# Altium schematic symbol library jlcpcb_2025_04_capacitors_extended_0805.schlib: 3281 symbols (part 6 of 18) (continued)
## C0805X332K251T
designator C?  Capacitance: 3.3nF  (hidden comment: *)
Capacitor, Ceramic (MLCC), 3.3nF, ±10%, 250V, X7R, ±10%, SMD 0805; Manufacturer: IHHEC(HOLY STONE ENTERPRISE CO., LTD); Manufacturer Part Number: C0805X332K251T; Package Size: 0805; JLCPCB Basic Part: No; JLCPCB Part Number: C105958; Supplier 1: LCSC; Category: Capacitors - MLCC; Supplier Part Number 1: C105958; Tolerance: ±10%; Voltage Rating: 250V; Temperature Coefficient: X7R; RoHS: Yes; ComponentLink1Description: Datasheet; ComponentLink1URL: https://wmsc.lcsc.com/wmsc/upload/file/pdf/v2/lcsc/2304140030_IHHEC-HOLY-STONE-ENTERPRISE-CO---LTD-C0805X332K251T_C105958.pdf; ComponentLink2Description: JLCPCB Part URL; ComponentLink2URL: https://jlcpcb.com/partdetail/C105958; ComponentLink3Description: LCSC Part URL; ComponentLink3URL: https://lcsc.com/product-detail/Multilayer-Ceramic-Capacitors-MLCC---SMD-SMT_IHHECHOLY-STONE-ENTERPRISE-CO.%2C-LTD-IHHECHOLY-STONE-ENTERPRISE-CO.%2C-LTD-C0805X332K251T_C105958.html
footprint CAP-0805 (0805 (2012M) Capacitor)
pins: 1, 2

## C0805X333K251T
designator C?  Capacitance: 33nF  (hidden comment: *)
Capacitor, Ceramic (MLCC), 33nF, ±10%, 250V, X7R, ±10%, SMD 0805; Manufacturer: IHHEC(HOLY STONE ENTERPRISE CO., LTD); Manufacturer Part Number: C0805X333K251T; Package Size: 0805; JLCPCB Basic Part: No; JLCPCB Part Number: C2915751; Supplier 1: LCSC; Category: Capacitors - MLCC; Supplier Part Number 1: C2915751; Tolerance: ±10%; Voltage Rating: 250V; Temperature Coefficient: X7R; RoHS: Yes; ComponentLink1Description: Datasheet; ComponentLink1URL: https://wmsc.lcsc.com/wmsc/upload/file/pdf/v2/lcsc/2111172030_IHHEC-HOLY-STONE-ENTERPRISE-CO---LTD-C0805X333K251T_C2915751.pdf; ComponentLink2Description: JLCPCB Part URL; ComponentLink2URL: https://jlcpcb.com/partdetail/C2915751; ComponentLink3Description: LCSC Part URL; ComponentLink3URL: https://lcsc.com/product-detail/Multilayer-Ceramic-Capacitors-MLCC---SMD-SMT_IHHECHOLY-STONE-ENTERPRISE-CO.%2C-LTD-IHHECHOLY-STONE-ENTERPRISE-CO.%2C-LTD-C0805X333K251T_C2915751.html
footprint CAP-0805 (0805 (2012M) Capacitor)
pins: 1, 2

## C0805X391K101T
designator C?  Capacitance: 390pF  (hidden comment: *)
Capacitor, Ceramic (MLCC), 390pF, ±10%, 100V, X7R, ±10%, SMD 0805; Manufacturer: IHHEC(HOLY STONE ENTERPRISE CO., LTD); Manufacturer Part Number: C0805X391K101T; Package Size: 0805; JLCPCB Basic Part: No; JLCPCB Part Number: C340317; Supplier 1: LCSC; Category: Capacitors - MLCC; Supplier Part Number 1: C340317; Tolerance: ±10%; Voltage Rating: 100V; Temperature Coefficient: X7R; RoHS: Yes; ComponentLink1Description: Datasheet; ComponentLink1URL: https://wmsc.lcsc.com/wmsc/upload/file/pdf/v2/lcsc/2304140030_IHHEC-HOLY-STONE-ENTERPRISE-CO---LTD-C0805X391K101T_C340317.pdf; ComponentLink2Description: JLCPCB Part URL; ComponentLink2URL: https://jlcpcb.com/partdetail/C340317; ComponentLink3Description: LCSC Part URL; ComponentLink3URL: https://lcsc.com/product-detail/Multilayer-Ceramic-Capacitors-MLCC---SMD-SMT_IHHECHOLY-STONE-ENTERPRISE-CO.%2C-LTD-IHHECHOLY-STONE-ENTERPRISE-CO.%2C-LTD-C0805X391K101T_C340317.html
footprint CAP-0805 (0805 (2012M) Capacitor)
pins: 1, 2

## C0805X392K251T
designator C?  Capacitance: 3.9nF  (hidden comment: *)
Capacitor, Ceramic (MLCC), 3.9nF, ±10%, 250V, X7R, ±10%, SMD 0805; Manufacturer: IHHEC(HOLY STONE ENTERPRISE CO., LTD); Manufacturer Part Number: C0805X392K251T; Package Size: 0805; JLCPCB Basic Part: No; JLCPCB Part Number: C340301; Supplier 1: LCSC; Category: Capacitors - MLCC; Supplier Part Number 1: C340301; Tolerance: ±10%; Voltage Rating: 250V; Temperature Coefficient: X7R; RoHS: Yes; ComponentLink1Description: Datasheet; ComponentLink1URL: https://wmsc.lcsc.com/wmsc/upload/file/pdf/v2/lcsc/2304140030_IHHEC-HOLY-STONE-ENTERPRISE-CO---LTD-C0805X392K251T_C340301.pdf; ComponentLink2Description: JLCPCB Part URL; ComponentLink2URL: https://jlcpcb.com/partdetail/C340301; ComponentLink3Description: LCSC Part URL; ComponentLink3URL: https://lcsc.com/product-detail/Multilayer-Ceramic-Capacitors-MLCC---SMD-SMT_IHHECHOLY-STONE-ENTERPRISE-CO.%2C-LTD-IHHECHOLY-STONE-ENTERPRISE-CO.%2C-LTD-C0805X392K251T_C340301.html
footprint CAP-0805 (0805 (2012M) Capacitor)
pins: 1, 2

## C0805X471K050T
designator C?  Capacitance: 470pF  (hidden comment: *)
Capacitor, Ceramic (MLCC), 470pF, ±10%, 50V, X7R, ±10%, SMD 0805; Manufacturer: IHHEC(HOLY STONE ENTERPRISE CO., LTD); Manufacturer Part Number: C0805X471K050T; Package Size: 0805; JLCPCB Basic Part: No; JLCPCB Part Number: C559301; Supplier 1: LCSC; Category: Capacitors - MLCC; Supplier Part Number 1: C559301; Tolerance: ±10%; Voltage Rating: 50V; Temperature Coefficient: X7R; RoHS: Yes; ComponentLink1Description: Datasheet; ComponentLink1URL: https://wmsc.lcsc.com/wmsc/upload/file/pdf/v2/lcsc/2005271132_IHHEC-HOLY-STONE-ENTERPRISE-CO---LTD-C0805X471K050T_C559301.pdf; ComponentLink2Description: JLCPCB Part URL; ComponentLink2URL: https://jlcpcb.com/partdetail/C559301; ComponentLink3Description: LCSC Part URL; ComponentLink3URL: https://lcsc.com/product-detail/Multilayer-Ceramic-Capacitors-MLCC---SMD-SMT_IHHECHOLY-STONE-ENTERPRISE-CO.%2C-LTD-IHHECHOLY-STONE-ENTERPRISE-CO.%2C-LTD-C0805X471K050T_C559301.html
footprint CAP-0805 (0805 (2012M) Capacitor)
pins: 1, 2

## C0805X471K102T
designator C?  Capacitance: 470pF  (hidden comment: *)
Capacitor, Ceramic (MLCC), 470pF, ±10%, 1kV, X7R, ±10%, SMD 0805; Manufacturer: IHHEC(HOLY STONE ENTERPRISE CO., LTD); Manufacturer Part Number: C0805X471K102T; Package Size: 0805; JLCPCB Basic Part: No; JLCPCB Part Number: C2915752; Supplier 1: LCSC; Category: Capacitors - MLCC; Supplier Part Number 1: C2915752; Tolerance: ±10%; Voltage Rating: 1kV; Temperature Coefficient: X7R; RoHS: Yes; ComponentLink1Description: Datasheet; ComponentLink1URL: https://wmsc.lcsc.com/wmsc/upload/file/pdf/v2/lcsc/2111172030_IHHEC-HOLY-STONE-ENTERPRISE-CO---LTD-C0805X471K102T_C2915752.pdf; ComponentLink2Description: JLCPCB Part URL; ComponentLink2URL: https://jlcpcb.com/partdetail/C2915752; ComponentLink3Description: LCSC Part URL; ComponentLink3URL: https://lcsc.com/product-detail/Multilayer-Ceramic-Capacitors-MLCC---SMD-SMT_IHHECHOLY-STONE-ENTERPRISE-CO.%2C-LTD-IHHECHOLY-STONE-ENTERPRISE-CO.%2C-LTD-C0805X471K102T_C2915752.html
footprint CAP-0805 (0805 (2012M) Capacitor)
pins: 1, 2

## C0805X472K501T
designator C?  Capacitance: 4.7nF  (hidden comment: *)
Capacitor, Ceramic (MLCC), 4.7nF, 500V, X7R, SMD 0805; Manufacturer: IHHEC(HOLY STONE ENTERPRISE CO., LTD); Manufacturer Part Number: C0805X472K501T; Package Size: 0805; JLCPCB Basic Part: No; JLCPCB Part Number: C2915754; Supplier 1: LCSC; Category: Capacitors - MLCC; Supplier Part Number 1: C2915754; Voltage Rating: 500V; Temperature Coefficient: X7R; RoHS: Yes; ComponentLink1Description: Datasheet; ComponentLink1URL: https://wmsc.lcsc.com/wmsc/upload/file/pdf/v2/lcsc/2111161830_IHHEC-HOLY-STONE-ENTERPRISE-CO---LTD-C0805X472K501T_C2915754.pdf; ComponentLink2Description: JLCPCB Part URL; ComponentLink2URL: https://jlcpcb.com/partdetail/C2915754; ComponentLink3Description: LCSC Part URL; ComponentLink3URL: https://lcsc.com/product-detail/Multilayer-Ceramic-Capacitors-MLCC---SMD-SMT_IHHECHOLY-STONE-ENTERPRISE-CO.%2C-LTD-IHHECHOLY-STONE-ENTERPRISE-CO.%2C-LTD-C0805X472K501T_C2915754.html
footprint CAP-0805 (0805 (2012M) Capacitor)
pins: 1, 2

## C0805X473K101T
designator C?  Capacitance: 47nF  (hidden comment: *)
Capacitor, Ceramic (MLCC), 47nF, ±10%, 100V, X7R, ±10%, SMD 0805; Manufacturer: IHHEC(HOLY STONE ENTERPRISE CO., LTD); Manufacturer Part Number: C0805X473K101T; Package Size: 0805; JLCPCB Basic Part: No; JLCPCB Part Number: C105959; Supplier 1: LCSC; Category: Capacitors - MLCC; Supplier Part Number 1: C105959; Tolerance: ±10%; Voltage Rating: 100V; Temperature Coefficient: X7R; RoHS: Yes; ComponentLink1Description: Datasheet; ComponentLink1URL: https://wmsc.lcsc.com/wmsc/upload/file/pdf/v2/lcsc/2304140030_IHHEC-HOLY-STONE-ENTERPRISE-CO---LTD-C0805X473K101T_C105959.pdf; ComponentLink2Description: JLCPCB Part URL; ComponentLink2URL: https://jlcpcb.com/partdetail/C105959; ComponentLink3Description: LCSC Part URL; ComponentLink3URL: https://lcsc.com/product-detail/Multilayer-Ceramic-Capacitors-MLCC---SMD-SMT_IHHECHOLY-STONE-ENTERPRISE-CO.%2C-LTD-IHHECHOLY-STONE-ENTERPRISE-CO.%2C-LTD-C0805X473K101T_C105959.html
footprint CAP-0805 (0805 (2012M) Capacitor)
pins: 1, 2

## C0805X473K251T
designator C?  Capacitance: 47nF  (hidden comment: *)
Capacitor, Ceramic (MLCC), 47nF, ±10%, 250V, X7R, ±10%, SMD 0805; Manufacturer: IHHEC(HOLY STONE ENTERPRISE CO., LTD); Manufacturer Part Number: C0805X473K251T; Package Size: 0805; JLCPCB Basic Part: No; JLCPCB Part Number: C340310; Supplier 1: LCSC; Category: Capacitors - MLCC; Supplier Part Number 1: C340310; Tolerance: ±10%; Voltage Rating: 250V; Temperature Coefficient: X7R; RoHS: Yes; ComponentLink1Description: Datasheet; ComponentLink1URL: https://wmsc.lcsc.com/wmsc/upload/file/pdf/v2/lcsc/2304140030_IHHEC-HOLY-STONE-ENTERPRISE-CO---LTD-C0805X473K251T_C340310.pdf; ComponentLink2Description: JLCPCB Part URL; ComponentLink2URL: https://jlcpcb.com/partdetail/C340310; ComponentLink3Description: LCSC Part URL; ComponentLink3URL: https://lcsc.com/product-detail/Multilayer-Ceramic-Capacitors-MLCC---SMD-SMT_IHHECHOLY-STONE-ENTERPRISE-CO.%2C-LTD-IHHECHOLY-STONE-ENTERPRISE-CO.%2C-LTD-C0805X473K251T_C340310.html
footprint CAP-0805 (0805 (2012M) Capacitor)
pins: 1, 2

## C0805X474K5RACAUTO
designator C?  Capacitance: 470nF  (hidden comment: *)
Capacitor, Ceramic (MLCC), 470nF, ±10%, 50V, X7R, ±10%, SMD 0805; Manufacturer: KEMET; Manufacturer Part Number: C0805X474K5RACAUTO; Package Size: 0805; JLCPCB Basic Part: No; JLCPCB Part Number: C2173145; Supplier 1: LCSC; Category: Capacitors - MLCC; Supplier Part Number 1: C2173145; Tolerance: ±10%; Voltage Rating: 50V; Temperature Coefficient: X7R; RoHS: Yes; ComponentLink1Description: Datasheet; ComponentLink1URL: https://wmsc.lcsc.com/wmsc/upload/file/pdf/v2/lcsc/2202040630_KEMET-C0805X474K5RACAUTO_C2173145.pdf; ComponentLink2Description: JLCPCB Part URL; ComponentLink2URL: https://jlcpcb.com/partdetail/C2173145; ComponentLink3Description: LCSC Part URL; ComponentLink3URL: https://lcsc.com/product-detail/Multilayer-Ceramic-Capacitors-MLCC---SMD-SMT_KEMET-KEMET-C0805X474K5RACAUTO_C2173145.html
footprint CAP-0805 (0805 (2012M) Capacitor)
pins: 1, 2

## C0805X474K050T
designator C?  Capacitance: 470nF  (hidden comment: *)
Capacitor, Ceramic (MLCC), 470nF, ±10%, 50V, X7R, ±10%, SMD 0805; Manufacturer: IHHEC(HOLY STONE ENTERPRISE CO., LTD); Manufacturer Part Number: C0805X474K050T; Package Size: 0805; JLCPCB Basic Part: No; JLCPCB Part Number: C340300; Supplier 1: LCSC; Category: Capacitors - MLCC; Supplier Part Number 1: C340300; Tolerance: ±10%; Voltage Rating: 50V; Temperature Coefficient: X7R; RoHS: Yes; ComponentLink1Description: Datasheet; ComponentLink1URL: https://wmsc.lcsc.com/wmsc/upload/file/pdf/v2/lcsc/2304140030_IHHEC-HOLY-STONE-ENTERPRISE-CO---LTD-C0805X474K050T_C340300.pdf; ComponentLink2Description: JLCPCB Part URL; ComponentLink2URL: https://jlcpcb.com/partdetail/C340300; ComponentLink3Description: LCSC Part URL; ComponentLink3URL: https://lcsc.com/product-detail/Multilayer-Ceramic-Capacitors-MLCC---SMD-SMT_IHHECHOLY-STONE-ENTERPRISE-CO.%2C-LTD-IHHECHOLY-STONE-ENTERPRISE-CO.%2C-LTD-C0805X474K050T_C340300.html
footprint CAP-0805 (0805 (2012M) Capacitor)
pins: 1, 2

## C0805X474K101T
designator C?  Capacitance: 470nF  (hidden comment: *)
Capacitor, Ceramic (MLCC), 470nF, ±10%, 100V, X7R, ±10%, SMD 0805; Manufacturer: IHHEC(HOLY STONE ENTERPRISE CO., LTD); Manufacturer Part Number: C0805X474K101T; Package Size: 0805; JLCPCB Basic Part: No; JLCPCB Part Number: C915817; Supplier 1: LCSC; Category: Capacitors - MLCC; Supplier Part Number 1: C915817; Tolerance: ±10%; Voltage Rating: 100V; Temperature Coefficient: X7R; RoHS: Yes; ComponentLink1Description: Datasheet; ComponentLink1URL: https://wmsc.lcsc.com/wmsc/upload/file/pdf/v2/lcsc/2304140030_IHHEC-HOLY-STONE-ENTERPRISE-CO---LTD-C0805X474K101T_C915817.pdf; ComponentLink2Description: JLCPCB Part URL; ComponentLink2URL: https://jlcpcb.com/partdetail/C915817; ComponentLink3Description: LCSC Part URL; ComponentLink3URL: https://lcsc.com/product-detail/Multilayer-Ceramic-Capacitors-MLCC---SMD-SMT_IHHECHOLY-STONE-ENTERPRISE-CO.%2C-LTD-IHHECHOLY-STONE-ENTERPRISE-CO.%2C-LTD-C0805X474K101T_C915817.html
footprint CAP-0805 (0805 (2012M) Capacitor)
pins: 1, 2

## C0805X475K025TW
designator C?  Capacitance: 4.7uF  (hidden comment: *)
Capacitor, Ceramic (MLCC), 4.7uF, ±10%, 25V, ±10%, SMD 0805; Manufacturer: IHHEC(HOLY STONE ENTERPRISE CO., LTD); Manufacturer Part Number: C0805X475K025TW; Package Size: 0805; JLCPCB Basic Part: No; JLCPCB Part Number: C192256; Supplier 1: LCSC; Category: Capacitors - MLCC; Supplier Part Number 1: C192256; Tolerance: ±10%; Voltage Rating: 25V; RoHS: Yes; ComponentLink1Description: Datasheet; ComponentLink2Description: JLCPCB Part URL; ComponentLink2URL: https://jlcpcb.com/partdetail/C192256; ComponentLink3Description: LCSC Part URL; ComponentLink3URL: https://lcsc.com/product-detail/Multilayer-Ceramic-Capacitors-MLCC---SMD-SMT_IHHECHOLY-STONE-ENTERPRISE-CO.%2C-LTD-IHHECHOLY-STONE-ENTERPRISE-CO.%2C-LTD-C0805X475K025TW_C192256.html
footprint CAP-0805 (0805 (2012M) Capacitor)
pins: 1, 2

## C0805X681K101T
designator C?  Capacitance: 680pF  (hidden comment: *)
Capacitor, Ceramic (MLCC), 680pF, ±10%, 100V, X7R, ±10%, SMD 0805; Manufacturer: IHHEC(HOLY STONE ENTERPRISE CO., LTD); Manufacturer Part Number: C0805X681K101T; Package Size: 0805; JLCPCB Basic Part: No; JLCPCB Part Number: C559284; Supplier 1: LCSC; Category: Capacitors - MLCC; Supplier Part Number 1: C559284; Tolerance: ±10%; Voltage Rating: 100V; Temperature Coefficient: X7R; RoHS: Yes; ComponentLink1Description: Datasheet; ComponentLink1URL: https://wmsc.lcsc.com/wmsc/upload/file/pdf/v2/lcsc/2304140030_IHHEC-HOLY-STONE-ENTERPRISE-CO---LTD-C0805X681K101T_C559284.pdf; ComponentLink2Description: JLCPCB Part URL; ComponentLink2URL: https://jlcpcb.com/partdetail/C559284; ComponentLink3Description: LCSC Part URL; ComponentLink3URL: https://lcsc.com/product-detail/Multilayer-Ceramic-Capacitors-MLCC---SMD-SMT_IHHECHOLY-STONE-ENTERPRISE-CO.%2C-LTD-IHHECHOLY-STONE-ENTERPRISE-CO.%2C-LTD-C0805X681K101T_C559284.html
footprint CAP-0805 (0805 (2012M) Capacitor)
pins: 1, 2

## C0805X681K201T
designator C?  Capacitance: 680pF  (hidden comment: *)
Capacitor, Ceramic (MLCC), 680pF, ±10%, 200V, X7R, ±10%, SMD 0805; Manufacturer: IHHEC(HOLY STONE ENTERPRISE CO., LTD); Manufacturer Part Number: C0805X681K201T; Package Size: 0805; JLCPCB Basic Part: No; JLCPCB Part Number: C559287; Supplier 1: LCSC; Category: Capacitors - MLCC; Supplier Part Number 1: C559287; Tolerance: ±10%; Voltage Rating: 200V; Temperature Coefficient: X7R; RoHS: Yes; ComponentLink1Description: Datasheet; ComponentLink1URL: https://wmsc.lcsc.com/wmsc/upload/file/pdf/v2/lcsc/2304140030_IHHEC-HOLY-STONE-ENTERPRISE-CO---LTD-C0805X681K201T_C559287.pdf; ComponentLink2Description: JLCPCB Part URL; ComponentLink2URL: https://jlcpcb.com/partdetail/C559287; ComponentLink3Description: LCSC Part URL; ComponentLink3URL: https://lcsc.com/product-detail/Multilayer-Ceramic-Capacitors-MLCC---SMD-SMT_IHHECHOLY-STONE-ENTERPRISE-CO.%2C-LTD-IHHECHOLY-STONE-ENTERPRISE-CO.%2C-LTD-C0805X681K201T_C559287.html
footprint CAP-0805 (0805 (2012M) Capacitor)
pins: 1, 2

## C0805X681K251T
designator C?  Capacitance: 680pF  (hidden comment: *)
Capacitor, Ceramic (MLCC), 680pF, ±10%, 250V, X7R, ±10%, SMD 0805; Manufacturer: IHHEC(HOLY STONE ENTERPRISE CO., LTD); Manufacturer Part Number: C0805X681K251T; Package Size: 0805; JLCPCB Basic Part: No; JLCPCB Part Number: C105960; Supplier 1: LCSC; Category: Capacitors - MLCC; Supplier Part Number 1: C105960; Tolerance: ±10%; Voltage Rating: 250V; Temperature Coefficient: X7R; RoHS: Yes; ComponentLink1Description: Datasheet; ComponentLink1URL: https://wmsc.lcsc.com/wmsc/upload/file/pdf/v2/lcsc/2304140030_IHHEC-HOLY-STONE-ENTERPRISE-CO---LTD-C0805X681K251T_C105960.pdf; ComponentLink2Description: JLCPCB Part URL; ComponentLink2URL: https://jlcpcb.com/partdetail/C105960; ComponentLink3Description: LCSC Part URL; ComponentLink3URL: https://lcsc.com/product-detail/Multilayer-Ceramic-Capacitors-MLCC---SMD-SMT_IHHECHOLY-STONE-ENTERPRISE-CO.%2C-LTD-IHHECHOLY-STONE-ENTERPRISE-CO.%2C-LTD-C0805X681K251T_C105960.html
footprint CAP-0805 (0805 (2012M) Capacitor)
pins: 1, 2

## C0805X683K101TB
designator C?  Capacitance: 68nF  (hidden comment: *)
Capacitor, Ceramic (MLCC), 68nF, ±10%, 100V, X7R, ±10%, SMD 0805; Manufacturer: IHHEC(HOLY STONE ENTERPRISE CO., LTD); Manufacturer Part Number: C0805X683K101TB; Package Size: 0805; JLCPCB Basic Part: No; JLCPCB Part Number: C559126; Supplier 1: LCSC; Category: Capacitors - MLCC; Supplier Part Number 1: C559126; Tolerance: ±10%; Voltage Rating: 100V; Temperature Coefficient: X7R; RoHS: Yes; ComponentLink1Description: Datasheet; ComponentLink1URL: https://wmsc.lcsc.com/wmsc/upload/file/pdf/v2/lcsc/2304140030_IHHEC-HOLY-STONE-ENTERPRISE-CO---LTD-C0805X683K101TB_C559126.pdf; ComponentLink2Description: JLCPCB Part URL; ComponentLink2URL: https://jlcpcb.com/partdetail/C559126; ComponentLink3Description: LCSC Part URL; ComponentLink3URL: https://lcsc.com/product-detail/Multilayer-Ceramic-Capacitors-MLCC---SMD-SMT_IHHECHOLY-STONE-ENTERPRISE-CO.%2C-LTD-IHHECHOLY-STONE-ENTERPRISE-CO.%2C-LTD-C0805X683K101TB_C559126.html
footprint CAP-0805 (0805 (2012M) Capacitor)
pins: 1, 2

## C0805X684K025T
designator C?  Capacitance: 680nF  (hidden comment: *)
Capacitor, Ceramic (MLCC), 680nF, 25V, X7R, SMD 0805; Manufacturer: IHHEC(HOLY STONE ENTERPRISE CO., LTD); Manufacturer Part Number: C0805X684K025T; Package Size: 0805; JLCPCB Basic Part: No; JLCPCB Part Number: C2940741; Supplier 1: LCSC; Category: Capacitors - MLCC; Supplier Part Number 1: C2940741; Voltage Rating: 25V; Temperature Coefficient: X7R; RoHS: Yes; ComponentLink1Description: Datasheet; ComponentLink1URL: https://wmsc.lcsc.com/wmsc/upload/file/pdf/v2/lcsc/2201121900_IHHEC-HOLY-STONE-ENTERPRISE-CO---LTD-C0805X684K025T_C2940741.pdf; ComponentLink2Description: JLCPCB Part URL; ComponentLink2URL: https://jlcpcb.com/partdetail/C2940741; ComponentLink3Description: LCSC Part URL; ComponentLink3URL: https://lcsc.com/product-detail/Multilayer-Ceramic-Capacitors-MLCC---SMD-SMT_IHHECHOLY-STONE-ENTERPRISE-CO.%2C-LTD-IHHECHOLY-STONE-ENTERPRISE-CO.%2C-LTD-C0805X684K025T_C2940741.html
footprint CAP-0805 (0805 (2012M) Capacitor)
pins: 1, 2

## C0805X684K050T
designator C?  Capacitance: 680nF  (hidden comment: *)
Capacitor, Ceramic (MLCC), 680nF, ±10%, 50V, X7R, ±10%, SMD 0805; Manufacturer: IHHEC(HOLY STONE ENTERPRISE CO., LTD); Manufacturer Part Number: C0805X684K050T; Package Size: 0805; JLCPCB Basic Part: No; JLCPCB Part Number: C559289; Supplier 1: LCSC; Category: Capacitors - MLCC; Supplier Part Number 1: C559289; Tolerance: ±10%; Voltage Rating: 50V; Temperature Coefficient: X7R; RoHS: Yes; ComponentLink1Description: Datasheet; ComponentLink1URL: https://wmsc.lcsc.com/wmsc/upload/file/pdf/v2/lcsc/2304140030_IHHEC-HOLY-STONE-ENTERPRISE-CO---LTD-C0805X684K050T_C559289.pdf; ComponentLink2Description: JLCPCB Part URL; ComponentLink2URL: https://jlcpcb.com/partdetail/C559289; ComponentLink3Description: LCSC Part URL; ComponentLink3URL: https://lcsc.com/product-detail/Multilayer-Ceramic-Capacitors-MLCC---SMD-SMT_IHHECHOLY-STONE-ENTERPRISE-CO.%2C-LTD-IHHECHOLY-STONE-ENTERPRISE-CO.%2C-LTD-C0805X684K050T_C559289.html
footprint CAP-0805 (0805 (2012M) Capacitor)
pins: 1, 2

## C0805X824K010T
designator C?  Capacitance: 820nF  (hidden comment: *)
Capacitor, Ceramic (MLCC), 820nF, ±10%, 10V, ±10%, SMD 0805; Manufacturer: IHHEC(HOLY STONE ENTERPRISE CO., LTD); Manufacturer Part Number: C0805X824K010T; Package Size: 0805; JLCPCB Basic Part: No; JLCPCB Part Number: C961510; Supplier 1: LCSC; Category: Capacitors - MLCC; Supplier Part Number 1: C961510; Tolerance: ±10%; Voltage Rating: 10V; RoHS: Yes; ComponentLink1Description: Datasheet; ComponentLink1URL: https://wmsc.lcsc.com/wmsc/upload/file/pdf/v2/lcsc/2304140030_IHHEC-HOLY-STONE-ENTERPRISE-CO---LTD-C0805X824K010T_C961510.pdf; ComponentLink2Description: JLCPCB Part URL; ComponentLink2URL: https://jlcpcb.com/partdetail/C961510; ComponentLink3Description: LCSC Part URL; ComponentLink3URL: https://lcsc.com/product-detail/Multilayer-Ceramic-Capacitors-MLCC---SMD-SMT_IHHECHOLY-STONE-ENTERPRISE-CO.%2C-LTD-IHHECHOLY-STONE-ENTERPRISE-CO.%2C-LTD-C0805X824K010T_C961510.html
footprint CAP-0805 (0805 (2012M) Capacitor)
pins: 1, 2

## C2012C0G1H030CT000N
designator C?  Capacitance: 3pF  (hidden comment: *)
Capacitor, Ceramic (MLCC), 3pF, 50V, C0G, SMD 0805; Manufacturer: TDK; Manufacturer Part Number: C2012C0G1H030CT000N; Package Size: 0805; JLCPCB Basic Part: No; JLCPCB Part Number: C76624; Supplier 1: LCSC; Category: Capacitors - MLCC; Supplier Part Number 1: C76624; Voltage Rating: 50V; Temperature Coefficient: C0G; RoHS: Yes; ComponentLink1Description: Datasheet; ComponentLink1URL: https://wmsc.lcsc.com/wmsc/upload/file/pdf/v2/lcsc/2304140030_TDK-C2012C0G1H030CT000N_C76624.pdf; ComponentLink2Description: JLCPCB Part URL; ComponentLink2URL: https://jlcpcb.com/partdetail/C76624; ComponentLink3Description: LCSC Part URL; ComponentLink3URL: https://lcsc.com/product-detail/Multilayer-Ceramic-Capacitors-MLCC---SMD-SMT_TDK-TDK-C2012C0G1H030CT000N_C76624.html
footprint CAP-0805 (0805 (2012M) Capacitor)
pins: 1, 2

## C2012C0G1H100DT000N
designator C?  Capacitance: 10pF  (hidden comment: *)
Capacitor, Ceramic (MLCC), 10pF, 50V, C0G, SMD 0805; Manufacturer: TDK; Manufacturer Part Number: C2012C0G1H100DT000N; Package Size: 0805; JLCPCB Basic Part: No; JLCPCB Part Number: C338017; Supplier 1: LCSC; Category: Capacitors - MLCC; Supplier Part Number 1: C338017; Voltage Rating: 50V; Temperature Coefficient: C0G; RoHS: Yes; ComponentLink1Description: Datasheet; ComponentLink1URL: https://wmsc.lcsc.com/wmsc/upload/file/pdf/v2/lcsc/2304140030_TDK-C2012C0G1H100DT000N_C338017.pdf; ComponentLink2Description: JLCPCB Part URL; ComponentLink2URL: https://jlcpcb.com/partdetail/C338017; ComponentLink3Description: LCSC Part URL; ComponentLink3URL: https://lcsc.com/product-detail/Multilayer-Ceramic-Capacitors-MLCC---SMD-SMT_TDK-TDK-C2012C0G1H100DT000N_C338017.html
footprint CAP-0805 (0805 (2012M) Capacitor)
pins: 1, 2

## C2012C0G1H101JT000N
designator C?  Capacitance: 100pF  (hidden comment: *)
Capacitor, Ceramic (MLCC), 100pF, ±5%, 50V, C0G, ±5%, SMD 0805; Manufacturer: TDK; Manufacturer Part Number: C2012C0G1H101JT000N; Package Size: 0805; JLCPCB Basic Part: No; JLCPCB Part Number: C531416; Supplier 1: LCSC; Category: Capacitors - MLCC; Supplier Part Number 1: C531416; Tolerance: ±5%; Voltage Rating: 50V; Temperature Coefficient: C0G; RoHS: Yes; ComponentLink1Description: Datasheet; ComponentLink2Description: JLCPCB Part URL; ComponentLink2URL: https://jlcpcb.com/partdetail/C531416; ComponentLink3Description: LCSC Part URL; ComponentLink3URL: https://lcsc.com/product-detail/Multilayer-Ceramic-Capacitors-MLCC---SMD-SMT_TDK-TDK-C2012C0G1H101JT000N_C531416.html
footprint CAP-0805 (0805 (2012M) Capacitor)
pins: 1, 2

## C2012C0G1H102JT000N
designator C?  Capacitance: 1nF  (hidden comment: *)
Capacitor, Ceramic (MLCC), 1nF, ±5%, 50V, C0G, ±5%, SMD 0805; Manufacturer: TDK; Manufacturer Part Number: C2012C0G1H102JT000N; Package Size: 0805; JLCPCB Basic Part: No; JLCPCB Part Number: C76625; Supplier 1: LCSC; Category: Capacitors - MLCC; Supplier Part Number 1: C76625; Tolerance: ±5%; Voltage Rating: 50V; Temperature Coefficient: C0G; RoHS: Yes; ComponentLink1Description: Datasheet; ComponentLink1URL: https://wmsc.lcsc.com/wmsc/upload/file/pdf/v2/lcsc/2304140030_TDK-C2012C0G1H102JT000N_C76625.pdf; ComponentLink2Description: JLCPCB Part URL; ComponentLink2URL: https://jlcpcb.com/partdetail/C76625; ComponentLink3Description: LCSC Part URL; ComponentLink3URL: https://lcsc.com/product-detail/Multilayer-Ceramic-Capacitors-MLCC---SMD-SMT_TDK-TDK-C2012C0G1H102JT000N_C76625.html
footprint CAP-0805 (0805 (2012M) Capacitor)
pins: 1, 2

## C2012C0G1H103JT000N
designator C?  Capacitance: 10nF  (hidden comment: *)
Capacitor, Ceramic (MLCC), 10nF, ±5%, 50V, C0G, ±5%, SMD 0805; Manufacturer: TDK; Manufacturer Part Number: C2012C0G1H103JT000N; Package Size: 0805; JLCPCB Basic Part: No; JLCPCB Part Number: C76626; Supplier 1: LCSC; Category: Capacitors - MLCC; Supplier Part Number 1: C76626; Tolerance: ±5%; Voltage Rating: 50V; Temperature Coefficient: C0G; RoHS: Yes; ComponentLink1Description: Datasheet; ComponentLink1URL: https://wmsc.lcsc.com/wmsc/upload/file/pdf/v2/lcsc/2304140030_TDK-C2012C0G1H103JT000N_C76626.pdf; ComponentLink2Description: JLCPCB Part URL; ComponentLink2URL: https://jlcpcb.com/partdetail/C76626; ComponentLink3Description: LCSC Part URL; ComponentLink3URL: https://lcsc.com/product-detail/Multilayer-Ceramic-Capacitors-MLCC---SMD-SMT_TDK-TDK-C2012C0G1H103JT000N_C76626.html
footprint CAP-0805 (0805 (2012M) Capacitor)
pins: 1, 2

## C2012C0G1H122JT000N
designator C?  Capacitance: 1.2nF  (hidden comment: *)
Capacitor, Ceramic (MLCC), 1.2nF, ±5%, 50V, C0G, ±5%, SMD 0805; Manufacturer: TDK; Manufacturer Part Number: C2012C0G1H122JT000N; Package Size: 0805; JLCPCB Basic Part: No; JLCPCB Part Number: C343020; Supplier 1: LCSC; Category: Capacitors - MLCC; Supplier Part Number 1: C343020; Tolerance: ±5%; Voltage Rating: 50V; Temperature Coefficient: C0G; RoHS: Yes; ComponentLink1Description: Datasheet; ComponentLink1URL: https://wmsc.lcsc.com/wmsc/upload/file/pdf/v2/lcsc/2304140030_TDK-C2012C0G1H122JT000N_C343020.pdf; ComponentLink2Description: JLCPCB Part URL; ComponentLink2URL: https://jlcpcb.com/partdetail/C343020; ComponentLink3Description: LCSC Part URL; ComponentLink3URL: https://lcsc.com/product-detail/Multilayer-Ceramic-Capacitors-MLCC---SMD-SMT_TDK-TDK-C2012C0G1H122JT000N_C343020.html
footprint CAP-0805 (0805 (2012M) Capacitor)
pins: 1, 2

## C2012C0G1H152JT000N
designator C?  Capacitance: 1.5nF  (hidden comment: *)
Capacitor, Ceramic (MLCC), 1.5nF, ±5%, 50V, C0G, ±5%, SMD 0805; Manufacturer: TDK; Manufacturer Part Number: C2012C0G1H152JT000N; Package Size: 0805; JLCPCB Basic Part: No; JLCPCB Part Number: C343021; Supplier 1: LCSC; Category: Capacitors - MLCC; Supplier Part Number 1: C343021; Tolerance: ±5%; Voltage Rating: 50V; Temperature Coefficient: C0G; RoHS: Yes; ComponentLink1Description: Datasheet; ComponentLink1URL: https://wmsc.lcsc.com/wmsc/upload/file/pdf/v2/lcsc/2304140030_TDK-C2012C0G1H152JT000N_C343021.pdf; ComponentLink2Description: JLCPCB Part URL; ComponentLink2URL: https://jlcpcb.com/partdetail/C343021; ComponentLink3Description: LCSC Part URL; ComponentLink3URL: https://lcsc.com/product-detail/Multilayer-Ceramic-Capacitors-MLCC---SMD-SMT_TDK-TDK-C2012C0G1H152JT000N_C343021.html
footprint CAP-0805 (0805 (2012M) Capacitor)
pins: 1, 2

## C2012C0G1H153JT000N
designator C?  Capacitance: 15nF  (hidden comment: *)
Capacitor, Ceramic (MLCC), 15nF, ±5%, 50V, C0G, ±5%, SMD 0805; Manufacturer: TDK; Manufacturer Part Number: C2012C0G1H153JT000N; Package Size: 0805; JLCPCB Basic Part: No; JLCPCB Part Number: C445728; Supplier 1: LCSC; Category: Capacitors - MLCC; Supplier Part Number 1: C445728; Tolerance: ±5%; Voltage Rating: 50V; Temperature Coefficient: C0G; RoHS: Yes; ComponentLink1Description: Datasheet; ComponentLink1URL: https://wmsc.lcsc.com/wmsc/upload/file/pdf/v2/lcsc/2304140030_TDK-C2012C0G1H153JT000N_C445728.pdf; ComponentLink2Description: JLCPCB Part URL; ComponentLink2URL: https://jlcpcb.com/partdetail/C445728; ComponentLink3Description: LCSC Part URL; ComponentLink3URL: https://lcsc.com/product-detail/Multilayer-Ceramic-Capacitors-MLCC---SMD-SMT_TDK-TDK-C2012C0G1H153JT000N_C445728.html
footprint CAP-0805 (0805 (2012M) Capacitor)
pins: 1, 2

## C2012C0G1H182JT0H0N
designator C?  Capacitance: 1.8nF  (hidden comment: *)
Capacitor, Ceramic (MLCC), 1.8nF, ±5%, 50V, C0G, ±5%, SMD 0805; Manufacturer: TDK; Manufacturer Part Number: C2012C0G1H182JT0H0N; Package Size: 0805; JLCPCB Basic Part: No; JLCPCB Part Number: C343014; Supplier 1: LCSC; Category: Capacitors - MLCC; Supplier Part Number 1: C343014; Tolerance: ±5%; Voltage Rating: 50V; Temperature Coefficient: C0G; RoHS: Yes; ComponentLink1Description: Datasheet; ComponentLink1URL: https://wmsc.lcsc.com/wmsc/upload/file/pdf/v2/lcsc/2304140030_TDK-C2012C0G1H182JT0H0N_C343014.pdf; ComponentLink2Description: JLCPCB Part URL; ComponentLink2URL: https://jlcpcb.com/partdetail/C343014; ComponentLink3Description: LCSC Part URL; ComponentLink3URL: https://lcsc.com/product-detail/Multilayer-Ceramic-Capacitors-MLCC---SMD-SMT_TDK-TDK-C2012C0G1H182JT0H0N_C343014.html
footprint CAP-0805 (0805 (2012M) Capacitor)
pins: 1, 2

## C2012C0G1H222JT0H0N
designator C?  Capacitance: 2.2nF  (hidden comment: *)
Capacitor, Ceramic (MLCC), 2.2nF, ±5%, 50V, C0G, ±5%, SMD 0805; Manufacturer: TDK; Manufacturer Part Number: C2012C0G1H222JT0H0N; Package Size: 0805; JLCPCB Basic Part: No; JLCPCB Part Number: C343016; Supplier 1: LCSC; Category: Capacitors - MLCC; Supplier Part Number 1: C343016; Tolerance: ±5%; Voltage Rating: 50V; Temperature Coefficient: C0G; RoHS: Yes; ComponentLink1Description: Datasheet; ComponentLink1URL: https://wmsc.lcsc.com/wmsc/upload/file/pdf/v2/lcsc/2304140030_TDK-C2012C0G1H222JT0H0N_C343016.pdf; ComponentLink2Description: JLCPCB Part URL; ComponentLink2URL: https://jlcpcb.com/partdetail/C343016; ComponentLink3Description: LCSC Part URL; ComponentLink3URL: https://lcsc.com/product-detail/Multilayer-Ceramic-Capacitors-MLCC---SMD-SMT_TDK-TDK-C2012C0G1H222JT0H0N_C343016.html
footprint CAP-0805 (0805 (2012M) Capacitor)
pins: 1, 2

## C2012C0G1H222JT000N
designator C?  Capacitance: 2.2nF  (hidden comment: *)
Capacitor, Ceramic (MLCC), 2.2nF, ±5%, 50V, C0G, ±5%, SMD 0805; Manufacturer: TDK; Manufacturer Part Number: C2012C0G1H222JT000N; Package Size: 0805; JLCPCB Basic Part: No; JLCPCB Part Number: C343015; Supplier 1: LCSC; Category: Capacitors - MLCC; Supplier Part Number 1: C343015; Tolerance: ±5%; Voltage Rating: 50V; Temperature Coefficient: C0G; RoHS: Yes; ComponentLink1Description: Datasheet; ComponentLink1URL: https://wmsc.lcsc.com/wmsc/upload/file/pdf/v2/lcsc/2304140030_TDK-C2012C0G1H222JT000N_C343015.pdf; ComponentLink2Description: JLCPCB Part URL; ComponentLink2URL: https://jlcpcb.com/partdetail/C343015; ComponentLink3Description: LCSC Part URL; ComponentLink3URL: https://lcsc.com/product-detail/Multilayer-Ceramic-Capacitors-MLCC---SMD-SMT_TDK-TDK-C2012C0G1H222JT000N_C343015.html
footprint CAP-0805 (0805 (2012M) Capacitor)
pins: 1, 2

## C2012C0G1H223JT000N
designator C?  Capacitance: 22nF  (hidden comment: *)
Capacitor, Ceramic (MLCC), 22nF, ±5%, 50V, C0G, ±5%, SMD 0805; Manufacturer: TDK; Manufacturer Part Number: C2012C0G1H223JT000N; Package Size: 0805; JLCPCB Basic Part: No; JLCPCB Part Number: C342593; Supplier 1: LCSC; Category: Capacitors - MLCC; Supplier Part Number 1: C342593; Tolerance: ±5%; Voltage Rating: 50V; Temperature Coefficient: C0G; RoHS: Yes; ComponentLink1Description: Datasheet; ComponentLink1URL: https://wmsc.lcsc.com/wmsc/upload/file/pdf/v2/lcsc/1912111437_TDK-C2012C0G1H223JT000N_C342593.pdf; ComponentLink2Description: JLCPCB Part URL; ComponentLink2URL: https://jlcpcb.com/partdetail/C342593; ComponentLink3Description: LCSC Part URL; ComponentLink3URL: https://lcsc.com/product-detail/Multilayer-Ceramic-Capacitors-MLCC---SMD-SMT_TDK-TDK-C2012C0G1H223JT000N_C342593.html
footprint CAP-0805 (0805 (2012M) Capacitor)
pins: 1, 2

## C2012C0G1H301JT000N
designator C?  Capacitance: 300pF  (hidden comment: *)
Capacitor, Ceramic (MLCC), 300pF, ±5%, 50V, C0G, ±5%, SMD 0805; Manufacturer: TDK; Manufacturer Part Number: C2012C0G1H301JT000N; Package Size: 0805; JLCPCB Basic Part: No; JLCPCB Part Number: C338019; Supplier 1: LCSC; Category: Capacitors - MLCC; Supplier Part Number 1: C338019; Tolerance: ±5%; Voltage Rating: 50V; Temperature Coefficient: C0G; RoHS: Yes; ComponentLink1Description: Datasheet; ComponentLink1URL: https://wmsc.lcsc.com/wmsc/upload/file/pdf/v2/lcsc/2304140030_TDK-C2012C0G1H301JT000N_C338019.pdf; ComponentLink2Description: JLCPCB Part URL; ComponentLink2URL: https://jlcpcb.com/partdetail/C338019; ComponentLink3Description: LCSC Part URL; ComponentLink3URL: https://lcsc.com/product-detail/Multilayer-Ceramic-Capacitors-MLCC---SMD-SMT_TDK-TDK-C2012C0G1H301JT000N_C338019.html
footprint CAP-0805 (0805 (2012M) Capacitor)
pins: 1, 2

## C2012C0G1H331JT000N
designator C?  Capacitance: 330pF  (hidden comment: *)
Capacitor, Ceramic (MLCC), 330pF, ±5%, 50V, C0G, ±5%, SMD 0805; Manufacturer: TDK; Manufacturer Part Number: C2012C0G1H331JT000N; Package Size: 0805; JLCPCB Basic Part: No; JLCPCB Part Number: C694185; Supplier 1: LCSC; Category: Capacitors - MLCC; Supplier Part Number 1: C694185; Tolerance: ±5%; Voltage Rating: 50V; Temperature Coefficient: C0G; RoHS: Yes; ComponentLink1Description: Datasheet; ComponentLink1URL: https://wmsc.lcsc.com/wmsc/upload/file/pdf/v2/lcsc/2304140030_TDK-C2012C0G1H331JT000N_C694185.pdf; ComponentLink2Description: JLCPCB Part URL; ComponentLink2URL: https://jlcpcb.com/partdetail/C694185; ComponentLink3Description: LCSC Part URL; ComponentLink3URL: https://lcsc.com/product-detail/Multilayer-Ceramic-Capacitors-MLCC---SMD-SMT_TDK-TDK-C2012C0G1H331JT000N_C694185.html
footprint CAP-0805 (0805 (2012M) Capacitor)
pins: 1, 2

## C2012C0G1H332JT0H0N
designator C?  Capacitance: 3.3nF  (hidden comment: *)
Capacitor, Ceramic (MLCC), 3.3nF, ±5%, 50V, C0G, ±5%, SMD 0805; Manufacturer: TDK; Manufacturer Part Number: C2012C0G1H332JT0H0N; Package Size: 0805; JLCPCB Basic Part: No; JLCPCB Part Number: C342981; Supplier 1: LCSC; Category: Capacitors - MLCC; Supplier Part Number 1: C342981; Tolerance: ±5%; Voltage Rating: 50V; Temperature Coefficient: C0G; RoHS: Yes; ComponentLink1Description: Datasheet; ComponentLink1URL: https://wmsc.lcsc.com/wmsc/upload/file/pdf/v2/lcsc/2304140030_TDK-C2012C0G1H332JT0H0N_C342981.pdf; ComponentLink2Description: JLCPCB Part URL; ComponentLink2URL: https://jlcpcb.com/partdetail/C342981; ComponentLink3Description: LCSC Part URL; ComponentLink3URL: https://lcsc.com/product-detail/Multilayer-Ceramic-Capacitors-MLCC---SMD-SMT_TDK-TDK-C2012C0G1H332JT0H0N_C342981.html
footprint CAP-0805 (0805 (2012M) Capacitor)
pins: 1, 2

## C2012C0G1H332JT000N
designator C?  Capacitance: 3.3nF  (hidden comment: *)
Capacitor, Ceramic (MLCC), 3.3nF, ±5%, 50V, C0G, ±5%, SMD 0805; Manufacturer: TDK; Manufacturer Part Number: C2012C0G1H332JT000N; Package Size: 0805; JLCPCB Basic Part: No; JLCPCB Part Number: C342575; Supplier 1: LCSC; Category: Capacitors - MLCC; Supplier Part Number 1: C342575; Tolerance: ±5%; Voltage Rating: 50V; Temperature Coefficient: C0G; RoHS: Yes; ComponentLink1Description: Datasheet; ComponentLink1URL: https://wmsc.lcsc.com/wmsc/upload/file/pdf/v2/lcsc/2304140030_TDK-C2012C0G1H332JT000N_C342575.pdf; ComponentLink2Description: JLCPCB Part URL; ComponentLink2URL: https://jlcpcb.com/partdetail/C342575; ComponentLink3Description: LCSC Part URL; ComponentLink3URL: https://lcsc.com/product-detail/Multilayer-Ceramic-Capacitors-MLCC---SMD-SMT_TDK-TDK-C2012C0G1H332JT000N_C342575.html
footprint CAP-0805 (0805 (2012M) Capacitor)
pins: 1, 2

## C2012C0G1H333JT000N
designator C?  Capacitance: 33nF  (hidden comment: *)
Capacitor, Ceramic (MLCC), 33nF, ±5%, 50V, C0G, ±5%, SMD 0805; Manufacturer: TDK; Manufacturer Part Number: C2012C0G1H333JT000N; Package Size: 0805; JLCPCB Basic Part: No; JLCPCB Part Number: C76628; Supplier 1: LCSC; Category: Capacitors - MLCC; Supplier Part Number 1: C76628; Tolerance: ±5%; Voltage Rating: 50V; Temperature Coefficient: C0G; RoHS: Yes; ComponentLink1Description: Datasheet; ComponentLink1URL: https://wmsc.lcsc.com/wmsc/upload/file/pdf/v2/lcsc/2304140030_TDK-C2012C0G1H333JT000N_C76628.pdf; ComponentLink2Description: JLCPCB Part URL; ComponentLink2URL: https://jlcpcb.com/partdetail/C76628; ComponentLink3Description: LCSC Part URL; ComponentLink3URL: https://lcsc.com/product-detail/Multilayer-Ceramic-Capacitors-MLCC---SMD-SMT_TDK-TDK-C2012C0G1H333JT000N_C76628.html
footprint CAP-0805 (0805 (2012M) Capacitor)
pins: 1, 2

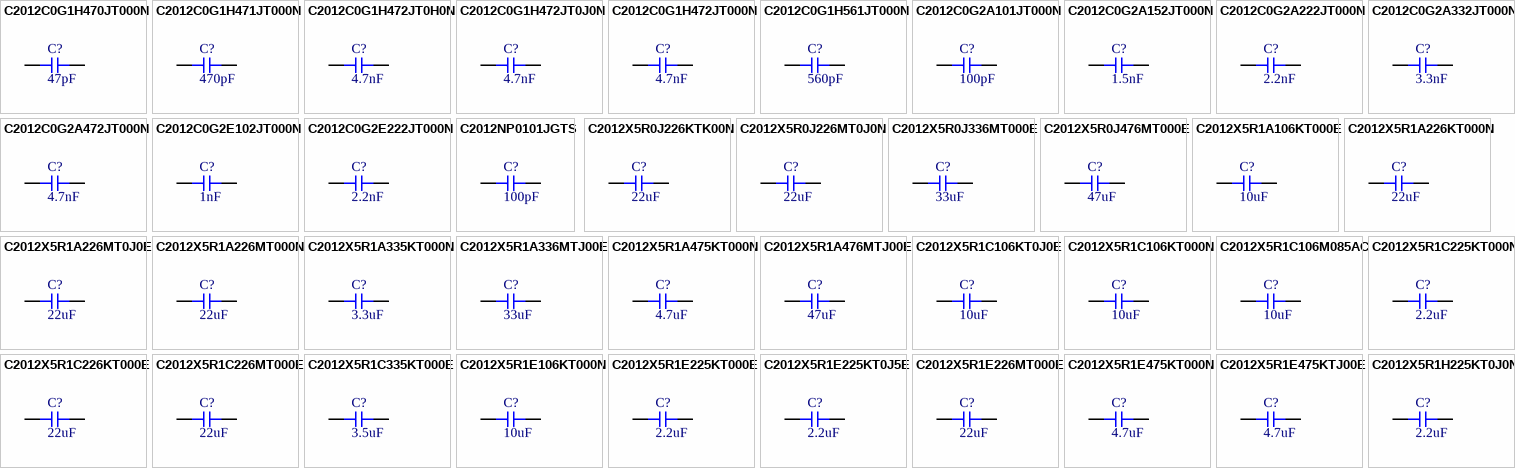
[diagram p27: symbols C2012C0G1H470JT000N to C2012X5R1H225KT0J0N]

## C2012C0G1H470JT000N
designator C?  Capacitance: 47pF  (hidden comment: *)
Capacitor, Ceramic (MLCC), 47pF, ±5%, 50V, C0G, ±5%, SMD 0805; Manufacturer: TDK; Manufacturer Part Number: C2012C0G1H470JT000N; Package Size: 0805; JLCPCB Basic Part: No; JLCPCB Part Number: C76629; Supplier 1: LCSC; Category: Capacitors - MLCC; Supplier Part Number 1: C76629; Tolerance: ±5%; Voltage Rating: 50V; Temperature Coefficient: C0G; RoHS: Yes; ComponentLink1Description: Datasheet; ComponentLink1URL: https://wmsc.lcsc.com/wmsc/upload/file/pdf/v2/lcsc/2304140030_TDK-C2012C0G1H470JT000N_C76629.pdf; ComponentLink2Description: JLCPCB Part URL; ComponentLink2URL: https://jlcpcb.com/partdetail/C76629; ComponentLink3Description: LCSC Part URL; ComponentLink3URL: https://lcsc.com/product-detail/Multilayer-Ceramic-Capacitors-MLCC---SMD-SMT_TDK-TDK-C2012C0G1H470JT000N_C76629.html
footprint CAP-0805 (0805 (2012M) Capacitor)
pins: 1, 2

## C2012C0G1H471JT000N
designator C?  Capacitance: 470pF  (hidden comment: *)
Capacitor, Ceramic (MLCC), 470pF, ±5%, 50V, C0G, ±5%, SMD 0805; Manufacturer: TDK; Manufacturer Part Number: C2012C0G1H471JT000N; Package Size: 0805; JLCPCB Basic Part: No; JLCPCB Part Number: C76630; Supplier 1: LCSC; Category: Capacitors - MLCC; Supplier Part Number 1: C76630; Tolerance: ±5%; Voltage Rating: 50V; Temperature Coefficient: C0G; RoHS: Yes; ComponentLink1Description: Datasheet; ComponentLink1URL: https://wmsc.lcsc.com/wmsc/upload/file/pdf/v2/lcsc/2304140030_TDK-C2012C0G1H471JT000N_C76630.pdf; ComponentLink2Description: JLCPCB Part URL; ComponentLink2URL: https://jlcpcb.com/partdetail/C76630; ComponentLink3Description: LCSC Part URL; ComponentLink3URL: https://lcsc.com/product-detail/Multilayer-Ceramic-Capacitors-MLCC---SMD-SMT_TDK-TDK-C2012C0G1H471JT000N_C76630.html
footprint CAP-0805 (0805 (2012M) Capacitor)
pins: 1, 2

## C2012C0G1H472JT0H0N
designator C?  Capacitance: 4.7nF  (hidden comment: *)
Capacitor, Ceramic (MLCC), 4.7nF, ±5%, 50V, C0G, ±5%, SMD 0805; Manufacturer: TDK; Manufacturer Part Number: C2012C0G1H472JT0H0N; Package Size: 0805; JLCPCB Basic Part: No; JLCPCB Part Number: C342964; Supplier 1: LCSC; Category: Capacitors - MLCC; Supplier Part Number 1: C342964; Tolerance: ±5%; Voltage Rating: 50V; Temperature Coefficient: C0G; RoHS: Yes; ComponentLink1Description: Datasheet; ComponentLink1URL: https://wmsc.lcsc.com/wmsc/upload/file/pdf/v2/lcsc/2304140030_TDK-C2012C0G1H472JT0H0N_C342964.pdf; ComponentLink2Description: JLCPCB Part URL; ComponentLink2URL: https://jlcpcb.com/partdetail/C342964; ComponentLink3Description: LCSC Part URL; ComponentLink3URL: https://lcsc.com/product-detail/Multilayer-Ceramic-Capacitors-MLCC---SMD-SMT_TDK-TDK-C2012C0G1H472JT0H0N_C342964.html
footprint CAP-0805 (0805 (2012M) Capacitor)
pins: 1, 2

## C2012C0G1H472JT0J0N
designator C?  Capacitance: 4.7nF  (hidden comment: *)
Capacitor, Ceramic (MLCC), 4.7nF, ±5%, 50V, C0G, ±5%, SMD 0805; Manufacturer: TDK; Manufacturer Part Number: C2012C0G1H472JT0J0N; Package Size: 0805; JLCPCB Basic Part: No; JLCPCB Part Number: C76631; Supplier 1: LCSC; Category: Capacitors - MLCC; Supplier Part Number 1: C76631; Tolerance: ±5%; Voltage Rating: 50V; Temperature Coefficient: C0G; RoHS: Yes; ComponentLink1Description: Datasheet; ComponentLink1URL: https://wmsc.lcsc.com/wmsc/upload/file/pdf/v2/lcsc/2304140030_TDK-C2012C0G1H472JT0J0N_C76631.pdf; ComponentLink2Description: JLCPCB Part URL; ComponentLink2URL: https://jlcpcb.com/partdetail/C76631; ComponentLink3Description: LCSC Part URL; ComponentLink3URL: https://lcsc.com/product-detail/Multilayer-Ceramic-Capacitors-MLCC---SMD-SMT_TDK-TDK-C2012C0G1H472JT0J0N_C76631.html
footprint CAP-0805 (0805 (2012M) Capacitor)
pins: 1, 2

## C2012C0G1H472JT000N
designator C?  Capacitance: 4.7nF  (hidden comment: *)
Capacitor, Ceramic (MLCC), 4.7nF, ±5%, 50V, C0G, ±5%, SMD 0805; Manufacturer: TDK; Manufacturer Part Number: C2012C0G1H472JT000N; Package Size: 0805; JLCPCB Basic Part: No; JLCPCB Part Number: C508855; Supplier 1: LCSC; Category: Capacitors - MLCC; Supplier Part Number 1: C508855; Tolerance: ±5%; Voltage Rating: 50V; Temperature Coefficient: C0G; RoHS: Yes; ComponentLink1Description: Datasheet; ComponentLink1URL: https://wmsc.lcsc.com/wmsc/upload/file/pdf/v2/lcsc/2304140030_TDK-C2012C0G1H472JT000N_C508855.pdf; ComponentLink2Description: JLCPCB Part URL; ComponentLink2URL: https://jlcpcb.com/partdetail/C508855; ComponentLink3Description: LCSC Part URL; ComponentLink3URL: https://lcsc.com/product-detail/Multilayer-Ceramic-Capacitors-MLCC---SMD-SMT_TDK-TDK-C2012C0G1H472JT000N_C508855.html
footprint CAP-0805 (0805 (2012M) Capacitor)
pins: 1, 2

## C2012C0G1H561JT000N
designator C?  Capacitance: 560pF  (hidden comment: *)
Capacitor, Ceramic (MLCC), 560pF, ±5%, 50V, C0G, ±5%, SMD 0805; Manufacturer: TDK; Manufacturer Part Number: C2012C0G1H561JT000N; Package Size: 0805; JLCPCB Basic Part: No; JLCPCB Part Number: C694186; Supplier 1: LCSC; Category: Capacitors - MLCC; Supplier Part Number 1: C694186; Tolerance: ±5%; Voltage Rating: 50V; Temperature Coefficient: C0G; RoHS: Yes; ComponentLink1Description: Datasheet; ComponentLink1URL: https://wmsc.lcsc.com/wmsc/upload/file/pdf/v2/lcsc/2304140030_TDK-C2012C0G1H561JT000N_C694186.pdf; ComponentLink2Description: JLCPCB Part URL; ComponentLink2URL: https://jlcpcb.com/partdetail/C694186; ComponentLink3Description: LCSC Part URL; ComponentLink3URL: https://lcsc.com/product-detail/Multilayer-Ceramic-Capacitors-MLCC---SMD-SMT_TDK-TDK-C2012C0G1H561JT000N_C694186.html
footprint CAP-0805 (0805 (2012M) Capacitor)
pins: 1, 2

## C2012C0G2A101JT000N
designator C?  Capacitance: 100pF  (hidden comment: *)
Capacitor, Ceramic (MLCC), 100pF, ±5%, 100V, C0G, ±5%, SMD 0805; Manufacturer: TDK; Manufacturer Part Number: C2012C0G2A101JT000N; Package Size: 0805; JLCPCB Basic Part: No; JLCPCB Part Number: C76633; Supplier 1: LCSC; Category: Capacitors - MLCC; Supplier Part Number 1: C76633; Tolerance: ±5%; Voltage Rating: 100V; Temperature Coefficient: C0G; RoHS: Yes; ComponentLink1Description: Datasheet; ComponentLink1URL: https://wmsc.lcsc.com/wmsc/upload/file/pdf/v2/lcsc/2304140030_TDK-C2012C0G2A101JT000N_C76633.pdf; ComponentLink2Description: JLCPCB Part URL; ComponentLink2URL: https://jlcpcb.com/partdetail/C76633; ComponentLink3Description: LCSC Part URL; ComponentLink3URL: https://lcsc.com/product-detail/Multilayer-Ceramic-Capacitors-MLCC---SMD-SMT_TDK-TDK-C2012C0G2A101JT000N_C76633.html
footprint CAP-0805 (0805 (2012M) Capacitor)
pins: 1, 2

## C2012C0G2A152JT000N
designator C?  Capacitance: 1.5nF  (hidden comment: *)
Capacitor, Ceramic (MLCC), 1.5nF, ±5%, 100V, C0G, ±5%, SMD 0805; Manufacturer: TDK; Manufacturer Part Number: C2012C0G2A152JT000N; Package Size: 0805; JLCPCB Basic Part: No; JLCPCB Part Number: C342996; Supplier 1: LCSC; Category: Capacitors - MLCC; Supplier Part Number 1: C342996; Tolerance: ±5%; Voltage Rating: 100V; Temperature Coefficient: C0G; RoHS: Yes; ComponentLink1Description: Datasheet; ComponentLink1URL: https://wmsc.lcsc.com/wmsc/upload/file/pdf/v2/lcsc/2304140030_TDK-C2012C0G2A152JT000N_C342996.pdf; ComponentLink2Description: JLCPCB Part URL; ComponentLink2URL: https://jlcpcb.com/partdetail/C342996; ComponentLink3Description: LCSC Part URL; ComponentLink3URL: https://lcsc.com/product-detail/Multilayer-Ceramic-Capacitors-MLCC---SMD-SMT_TDK-TDK-C2012C0G2A152JT000N_C342996.html
footprint CAP-0805 (0805 (2012M) Capacitor)
pins: 1, 2

## C2012C0G2A222JT000N
designator C?  Capacitance: 2.2nF  (hidden comment: *)
Capacitor, Ceramic (MLCC), 2.2nF, ±5%, 100V, C0G, ±5%, SMD 0805; Manufacturer: TDK; Manufacturer Part Number: C2012C0G2A222JT000N; Package Size: 0805; JLCPCB Basic Part: No; JLCPCB Part Number: C342986; Supplier 1: LCSC; Category: Capacitors - MLCC; Supplier Part Number 1: C342986; Tolerance: ±5%; Voltage Rating: 100V; Temperature Coefficient: C0G; RoHS: Yes; ComponentLink1Description: Datasheet; ComponentLink1URL: https://wmsc.lcsc.com/wmsc/upload/file/pdf/v2/lcsc/2304140030_TDK-C2012C0G2A222JT000N_C342986.pdf; ComponentLink2Description: JLCPCB Part URL; ComponentLink2URL: https://jlcpcb.com/partdetail/C342986; ComponentLink3Description: LCSC Part URL; ComponentLink3URL: https://lcsc.com/product-detail/Multilayer-Ceramic-Capacitors-MLCC---SMD-SMT_TDK-TDK-C2012C0G2A222JT000N_C342986.html
footprint CAP-0805 (0805 (2012M) Capacitor)
pins: 1, 2

## C2012C0G2A332JT000N
designator C?  Capacitance: 3.3nF  (hidden comment: *)
Capacitor, Ceramic (MLCC), 3.3nF, ±5%, 100V, C0G, ±5%, SMD 0805; Manufacturer: TDK; Manufacturer Part Number: C2012C0G2A332JT000N; Package Size: 0805; JLCPCB Basic Part: No; JLCPCB Part Number: C361190; Supplier 1: LCSC; Category: Capacitors - MLCC; Supplier Part Number 1: C361190; Tolerance: ±5%; Voltage Rating: 100V; Temperature Coefficient: C0G; RoHS: Yes; ComponentLink1Description: Datasheet; ComponentLink1URL: https://wmsc.lcsc.com/wmsc/upload/file/pdf/v2/lcsc/2304140030_TDK-C2012C0G2A332JT000N_C361190.pdf; ComponentLink2Description: JLCPCB Part URL; ComponentLink2URL: https://jlcpcb.com/partdetail/C361190; ComponentLink3Description: LCSC Part URL; ComponentLink3URL: https://lcsc.com/product-detail/Multilayer-Ceramic-Capacitors-MLCC---SMD-SMT_TDK-TDK-C2012C0G2A332JT000N_C361190.html
footprint CAP-0805 (0805 (2012M) Capacitor)
pins: 1, 2

## C2012C0G2A472JT000N
designator C?  Capacitance: 4.7nF  (hidden comment: *)
Capacitor, Ceramic (MLCC), 4.7nF, ±5%, 100V, C0G, ±5%, SMD 0805; Manufacturer: TDK; Manufacturer Part Number: C2012C0G2A472JT000N; Package Size: 0805; JLCPCB Basic Part: No; JLCPCB Part Number: C342588; Supplier 1: LCSC; Category: Capacitors - MLCC; Supplier Part Number 1: C342588; Tolerance: ±5%; Voltage Rating: 100V; Temperature Coefficient: C0G; RoHS: Yes; ComponentLink1Description: Datasheet; ComponentLink1URL: https://wmsc.lcsc.com/wmsc/upload/file/pdf/v2/lcsc/2304140030_TDK-C2012C0G2A472JT000N_C342588.pdf; ComponentLink2Description: JLCPCB Part URL; ComponentLink2URL: https://jlcpcb.com/partdetail/C342588; ComponentLink3Description: LCSC Part URL; ComponentLink3URL: https://lcsc.com/product-detail/Multilayer-Ceramic-Capacitors-MLCC---SMD-SMT_TDK-TDK-C2012C0G2A472JT000N_C342588.html
footprint CAP-0805 (0805 (2012M) Capacitor)
pins: 1, 2